# Altium footprint library AD_Lib.PcbLib: 508 footprints (part 13 of 32)
Each footprint in its own frame and in the unit in brackets; x right, y up, seen from the top. Pads: shape width x height; smd on the part's side, far side on the other; paste and mask are expansions set on the pad; w line width, h text height; cw(c..) or ccw(c..) is an arc to the next point about the centre after c.
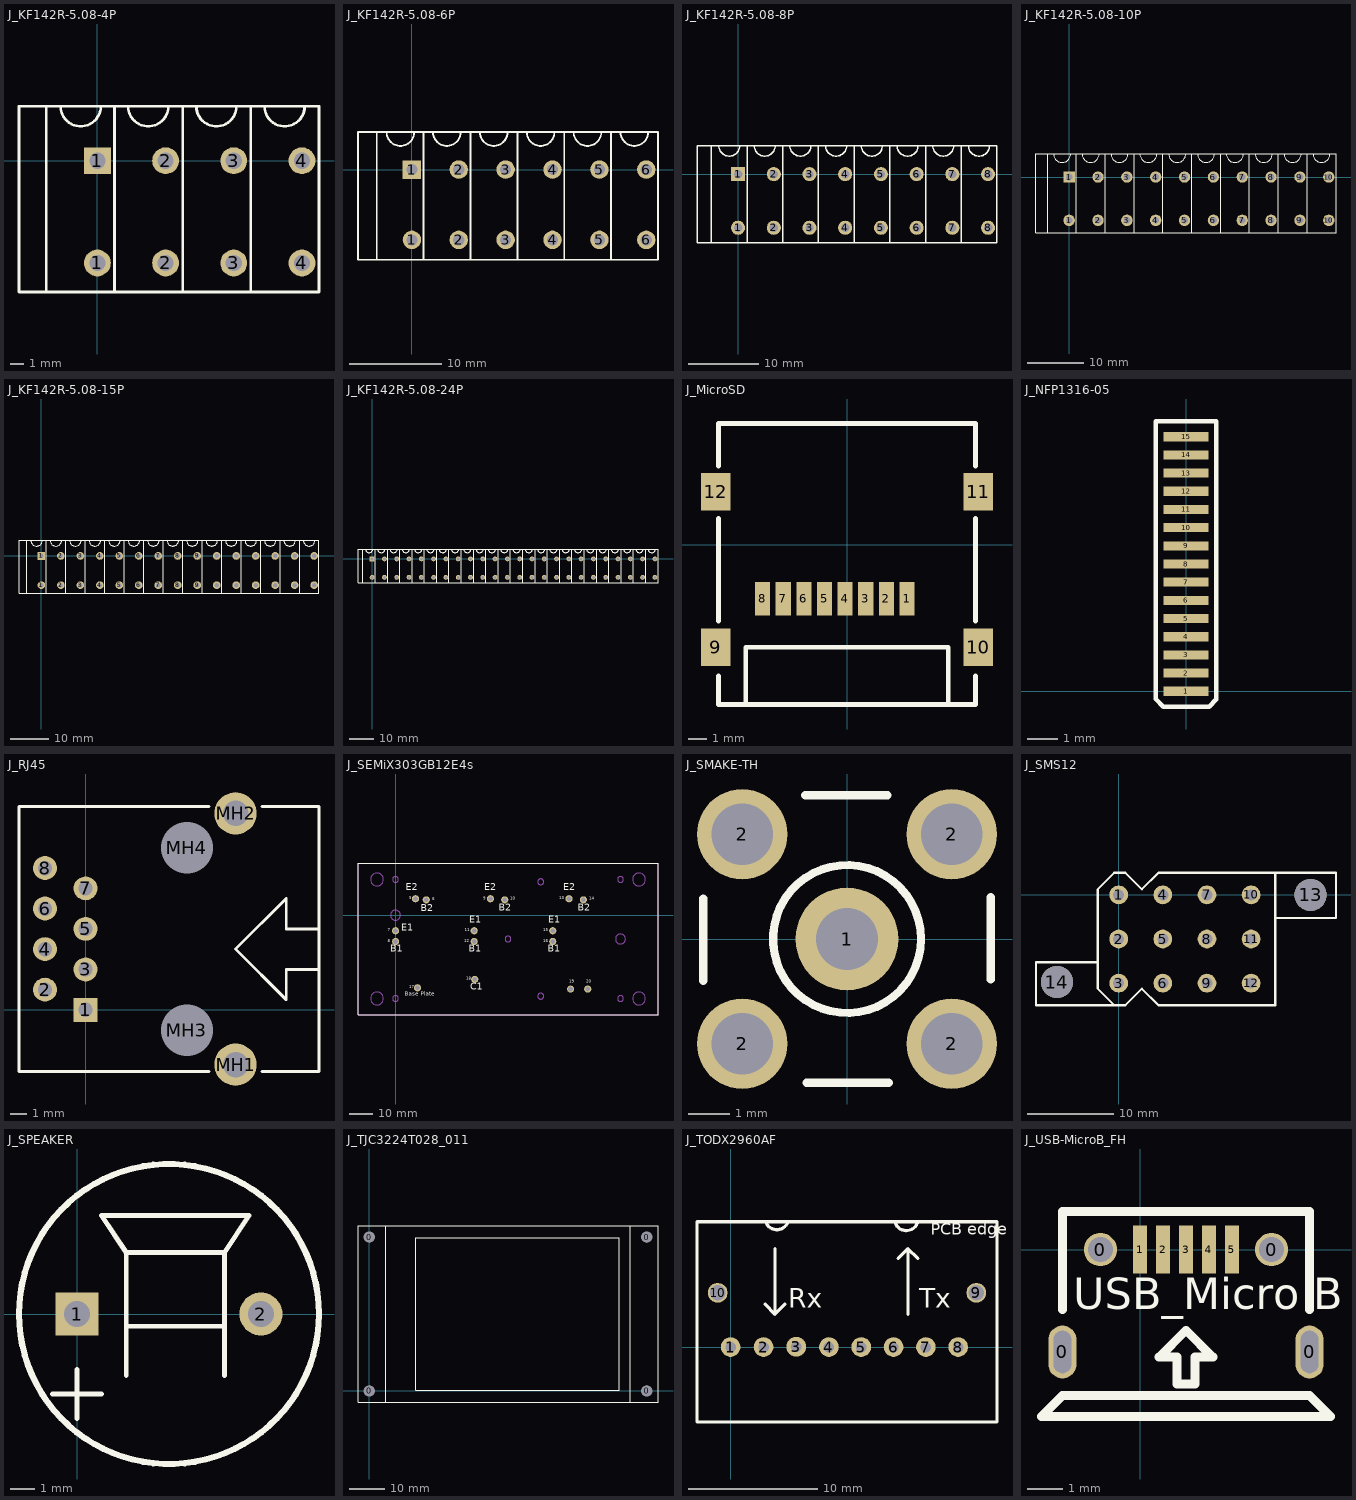
[diagram p12: the footprints below, top view; thin cyan lines are the x and y axes]

## J_KF142R-5.08-4P [mm] "弹簧式接线端子，可拼接；引脚间距5.08mm"
pads (8):
  round 2 hole 1.2: 1(0,-7.62) 2(5.08,-7.62) 2(5.08,0) 3(10.16,-7.62) 3(10.16,0) 4(15.24,-7.62) 4(15.24,0)
  rect 2x2 hole 1.2: 1(0,0)
Top Overlay:
  lines w0.2: -2.746,4.064 ccw(c-1.246,4.064) 0.254,4.064 ; 2.286,4.064 ccw(c3.786,4.064) 5.286,4.064 ; 7.366,4.064 ccw(c8.866,4.064) 10.366,4.064 ; 12.446,4.064 ccw(c13.946,4.064) 15.446,4.064 ; 6.35,-9.779 11.43,-9.779 ; 6.35,-9.779 6.35,4.064 ; 6.35,-9.779 -3.81,-9.779 -3.81,4.064 6.35,4.064 ; 6.35,4.064 11.43,4.064 ; 11.43,-9.779 16.51,-9.779 16.51,4.064 11.43,4.064 ; 11.43,-9.779 11.43,4.064
  lines w0.203: -3.81,-9.779 -5.842,-9.779 -5.842,4.064 -3.81,4.064 ; 1.27,-9.779 1.27,4.064

## J_KF142R-5.08-6P [mm] "弹簧式接线端子，可拼接；引脚间距5.08mm"
pads (12):
  round 2 hole 1.2: 1(0,-7.62) 2(5.08,-7.62) 2(5.08,0) 3(10.16,-7.62) 3(10.16,0) 4(15.24,-7.62) 4(15.24,0) 5(20.32,-7.62) 5(20.32,0) 6(25.4,-7.62) 6(25.4,0)
  rect 2x2 hole 1.2: 1(0,0)
Top Overlay:
  lines w0.2: -2.746,4.064 ccw(c-1.246,4.064) 0.254,4.064 ; 2.286,4.064 ccw(c3.786,4.064) 5.286,4.064 ; 7.366,4.064 ccw(c8.866,4.064) 10.366,4.064 ; 12.446,4.064 ccw(c13.946,4.064) 15.446,4.064 ; 17.526,4.064 ccw(c19.026,4.064) 20.526,4.064 ; 22.606,4.064 ccw(c24.106,4.064) 25.606,4.064 ; 6.35,-9.779 -3.81,-9.779 -3.81,4.064 6.35,4.064 ; 6.35,-9.779 6.35,4.064 ; 6.35,-9.779 11.43,-9.779 ; 6.35,4.064 11.43,4.064 ; 11.43,-9.779 11.43,4.064 ; 11.43,-9.779 16.51,-9.779 ; 11.43,4.064 16.51,4.064 ; 16.51,-9.779 16.51,4.064 ; 16.51,-9.779 21.59,-9.779 ; 16.51,4.064 21.59,4.064 ; 21.59,-9.779 21.59,4.064 ; 21.59,-9.779 26.67,-9.779 26.67,4.064 21.59,4.064
  lines w0.203: -3.81,-9.779 -5.842,-9.779 -5.842,4.064 -3.81,4.064 ; 1.27,-9.779 1.27,4.064

## J_KF142R-5.08-8P [mm] "弹簧式接线端子，可拼接；引脚间距5.08mm"
pads (16):
  round 2 hole 1.2: 1(0,-7.62) 2(5.08,-7.62) 2(5.08,0) 3(10.16,-7.62) 3(10.16,0) 4(15.24,-7.62) 4(15.24,0) 5(20.32,-7.62) 5(20.32,0) 6(25.4,-7.62) 6(25.4,0) 7(30.48,-7.62) 7(30.48,0) 8(35.56,-7.62) 8(35.56,0)
  rect 2x2 hole 1.2: 1(0,0)
Top Overlay:
  lines w0.2: -2.746,4.064 ccw(c-1.246,4.064) 0.254,4.064 ; 2.286,4.064 ccw(c3.786,4.064) 5.286,4.064 ; 7.366,4.064 ccw(c8.866,4.064) 10.366,4.064 ; 12.446,4.064 ccw(c13.946,4.064) 15.446,4.064 ; 17.526,4.064 ccw(c19.026,4.064) 20.526,4.064 ; 22.606,4.064 ccw(c24.106,4.064) 25.606,4.064 ; 27.686,4.064 ccw(c29.186,4.064) 30.686,4.064 ; 32.766,4.064 ccw(c34.266,4.064) 35.766,4.064 ; 6.35,-9.779 -3.81,-9.779 -3.81,4.064 6.35,4.064 ; 6.35,-9.779 6.35,4.064 ; 6.35,-9.779 11.43,-9.779 ; 6.35,4.064 11.43,4.064 ; 11.43,-9.779 11.43,4.064 ; 11.43,-9.779 16.51,-9.779 ; 11.43,4.064 16.51,4.064 ; 16.51,-9.779 16.51,4.064 ; 16.51,-9.779 21.59,-9.779 ; 16.51,4.064 21.59,4.064 ; 21.59,-9.779 21.59,4.064 ; 21.59,-9.779 26.67,-9.779 ; 21.59,4.064 26.67,4.064 ; 26.67,-9.779 26.67,4.064 ; 26.67,-9.779 31.75,-9.779 ; 26.67,4.064 31.75,4.064 ; 31.75,-9.779 31.75,4.064 ; 31.75,-9.779 36.83,-9.779 36.83,4.064 31.75,4.064
  lines w0.203: -3.81,-9.779 -5.842,-9.779 -5.842,4.064 -3.81,4.064 ; 1.27,-9.779 1.27,4.064

## J_KF142R-5.08-10P [mm] "弹簧式接线端子，可拼接；引脚间距5.08mm"
pads (20):
  round 2 hole 1.2: 1(0,-7.62) 2(5.08,-7.62) 2(5.08,0) 3(10.16,-7.62) 3(10.16,0) 4(15.24,-7.62) 4(15.24,0) 5(20.32,-7.62) 5(20.32,0) 6(25.4,-7.62) 6(25.4,0) 7(30.48,-7.62) 7(30.48,0) 8(35.56,-7.62) 8(35.56,0) 9(40.64,-7.62) 9(40.64,0) 10(45.72,-7.62) 10(45.72,0)
  rect 2x2 hole 1.2: 1(0,0)
Top Overlay:
  lines w0.2: -2.746,4.064 ccw(c-1.246,4.064) 0.254,4.064 ; 2.286,4.064 ccw(c3.786,4.064) 5.286,4.064 ; 7.366,4.064 ccw(c8.866,4.064) 10.366,4.064 ; 12.446,4.064 ccw(c13.946,4.064) 15.446,4.064 ; 17.526,4.064 ccw(c19.026,4.064) 20.526,4.064 ; 22.606,4.064 ccw(c24.106,4.064) 25.606,4.064 ; 27.686,4.064 ccw(c29.186,4.064) 30.686,4.064 ; 32.766,4.064 ccw(c34.266,4.064) 35.766,4.064 ; 37.846,4.064 ccw(c39.346,4.064) 40.846,4.064 ; 42.926,4.064 ccw(c44.426,4.064) 45.926,4.064 ; 6.35,-9.779 -3.81,-9.779 -3.81,4.064 6.35,4.064 ; 6.35,-9.779 6.35,4.064 ; 6.35,-9.779 11.43,-9.779 ; 6.35,4.064 11.43,4.064 ; 11.43,-9.779 11.43,4.064 ; 11.43,-9.779 16.51,-9.779 ; 11.43,4.064 16.51,4.064 ; 16.51,-9.779 16.51,4.064 ; 16.51,-9.779 21.59,-9.779 ; 16.51,4.064 21.59,4.064 ; 21.59,-9.779 21.59,4.064 ; 21.59,-9.779 26.67,-9.779 ; 21.59,4.064 26.67,4.064 ; 26.67,-9.779 26.67,4.064 ; 26.67,-9.779 31.75,-9.779 ; 26.67,4.064 31.75,4.064 ; 31.75,-9.779 31.75,4.064 ; 31.75,-9.779 36.83,-9.779 ; 31.75,4.064 36.83,4.064 ; 36.83,-9.779 36.83,4.064 ; 36.83,-9.779 41.91,-9.779 ; 36.83,4.064 41.91,4.064 ; 41.91,-9.779 41.91,4.064 ; 41.91,-9.779 46.99,-9.779 46.99,4.064 41.91,4.064
  lines w0.203: -3.81,-9.779 -5.842,-9.779 -5.842,4.064 -3.81,4.064 ; 1.27,-9.779 1.27,4.064

## J_KF142R-5.08-15P [mm] "弹簧式接线端子，可拼接；引脚间距5.08mm"
pads (30):
  round 2 hole 1.2: 1(0,-7.62) 2(5.08,-7.62) 2(5.08,0) 3(10.16,-7.62) 3(10.16,0) 4(15.24,-7.62) 4(15.24,0) 5(20.32,-7.62) 5(20.32,0) 6(25.4,-7.62) 6(25.4,0) 7(30.48,-7.62) 7(30.48,0) 8(35.56,-7.62) 8(35.56,0) 9(40.64,-7.62) 9(40.64,0) 10(45.72,-7.62) 10(45.72,0) 11(50.8,-7.62) 11(50.8,0) 12(55.88,-7.62) 12(55.88,0) 13(60.96,-7.62) 13(60.96,0) 14(66.04,-7.62) 14(66.04,0) 15(71.12,-7.62) 15(71.12,0)
  rect 2x2 hole 1.2: 1(0,0)
Top Overlay:
  lines w0.2: -2.746,4.064 ccw(c-1.246,4.064) 0.254,4.064 ; 2.286,4.064 ccw(c3.786,4.064) 5.286,4.064 ; 7.366,4.064 ccw(c8.866,4.064) 10.366,4.064 ; 12.446,4.064 ccw(c13.946,4.064) 15.446,4.064 ; 17.526,4.064 ccw(c19.026,4.064) 20.526,4.064 ; 22.606,4.064 ccw(c24.106,4.064) 25.606,4.064 ; 27.686,4.064 ccw(c29.186,4.064) 30.686,4.064 ; 32.766,4.064 ccw(c34.266,4.064) 35.766,4.064 ; 37.846,4.064 ccw(c39.346,4.064) 40.846,4.064 ; 42.926,4.064 ccw(c44.426,4.064) 45.926,4.064 ; 48.006,4.064 ccw(c49.506,4.064) 51.006,4.064 ; 53.086,4.064 ccw(c54.586,4.064) 56.086,4.064 ; 58.166,4.064 ccw(c59.666,4.064) 61.166,4.064 ; 63.246,4.064 ccw(c64.746,4.064) 66.246,4.064 ; 68.326,4.064 ccw(c69.826,4.064) 71.326,4.064 ; 6.35,-9.779 -3.81,-9.779 -3.81,4.064 6.35,4.064 ; 6.35,-9.779 6.35,4.064 ; 6.35,-9.779 11.43,-9.779 ; 6.35,4.064 11.43,4.064 ; 11.43,-9.779 11.43,4.064 ; 11.43,-9.779 16.51,-9.779 ; 11.43,4.064 16.51,4.064 ; 16.51,-9.779 16.51,4.064 ; 16.51,-9.779 21.59,-9.779 ; 16.51,4.064 21.59,4.064 ; 21.59,-9.779 21.59,4.064 ; 21.59,-9.779 26.67,-9.779 ; 21.59,4.064 26.67,4.064 ; 26.67,-9.779 26.67,4.064 ; 26.67,-9.779 31.75,-9.779 ; 26.67,4.064 31.75,4.064 ; 31.75,-9.779 31.75,4.064 ; 31.75,-9.779 36.83,-9.779 ; 31.75,4.064 36.83,4.064 ; 36.83,-9.779 36.83,4.064 ; 36.83,-9.779 41.91,-9.779 ; 36.83,4.064 41.91,4.064 ; 41.91,-9.779 41.91,4.064 ; 41.91,-9.779 46.99,-9.779 ; 41.91,4.064 46.99,4.064 ; 46.99,-9.779 52.07,-9.779 ; 46.99,-9.779 46.99,4.064 ; 46.99,4.064 52.07,4.064 ; 52.07,-9.779 57.15,-9.779 ; 52.07,-9.779 52.07,4.064 ; 52.07,4.064 57.15,4.064 ; 57.15,-9.779 62.23,-9.779 ; 57.15,-9.779 57.15,4.064 ; 57.15,4.064 62.23,4.064 ; 62.23,-9.779 67.31,-9.779 ; 62.23,-9.779 62.23,4.064 ; 62.23,4.064 67.31,4.064 ; 67.31,-9.779 67.31,4.064 ; 67.31,-9.779 72.39,-9.779 72.39,4.064 67.31,4.064
  lines w0.203: -3.81,-9.779 -5.842,-9.779 -5.842,4.064 -3.81,4.064 ; 1.27,-9.779 1.27,4.064

## J_KF142R-5.08-24P [mm] "弹簧式接线端子，可拼接；引脚间距5.08mm"
pads (48):
  round 2 hole 1.2: 1(0,-7.62) 2(5.08,-7.62) 2(5.08,0) 3(10.16,-7.62) 3(10.16,0) 4(15.24,-7.62) 4(15.24,0) 5(20.32,-7.62) 5(20.32,0) 6(25.4,-7.62) 6(25.4,0) 7(30.48,-7.62) 7(30.48,0) 8(35.56,-7.62) 8(35.56,0) 9(40.64,-7.62) 9(40.64,0) 10(45.72,-7.62) 10(45.72,0) 11(50.8,-7.62) 11(50.8,0) 12(55.88,-7.62) 12(55.88,0) 13(60.96,-7.62) 13(60.96,0) 14(66.04,-7.62) 14(66.04,0) 15(71.12,-7.62) 15(71.12,0) 16(76.2,-7.62) 16(76.2,0) 17(81.28,-7.62) 17(81.28,0) 18(86.36,-7.62) 18(86.36,0) 19(91.44,-7.62) 19(91.44,0) 20(96.52,-7.62) 20(96.52,0) 21(101.6,-7.62) 21(101.6,0) 22(106.68,-7.62) 22(106.68,0) 23(111.76,-7.62) 23(111.76,0) 24(116.84,-7.62) 24(116.84,0)
  rect 2x2 hole 1.2: 1(0,0)
Top Overlay:
  lines w0.2: -2.746,4.064 ccw(c-1.246,4.064) 0.254,4.064 ; 2.286,4.064 ccw(c3.786,4.064) 5.286,4.064 ; 7.366,4.064 ccw(c8.866,4.064) 10.366,4.064 ; 12.446,4.064 ccw(c13.946,4.064) 15.446,4.064 ; 17.526,4.064 ccw(c19.026,4.064) 20.526,4.064 ; 22.606,4.064 ccw(c24.106,4.064) 25.606,4.064 ; 27.686,4.064 ccw(c29.186,4.064) 30.686,4.064 ; 32.766,4.064 ccw(c34.266,4.064) 35.766,4.064 ; 37.846,4.064 ccw(c39.346,4.064) 40.846,4.064 ; 42.926,4.064 ccw(c44.426,4.064) 45.926,4.064 ; 48.006,4.064 ccw(c49.506,4.064) 51.006,4.064 ; 53.086,4.064 ccw(c54.586,4.064) 56.086,4.064 ; 58.166,4.064 ccw(c59.666,4.064) 61.166,4.064 ; 63.246,4.064 ccw(c64.746,4.064) 66.246,4.064 ; 68.326,4.064 ccw(c69.826,4.064) 71.326,4.064 ; 73.406,4.064 ccw(c74.906,4.064) 76.406,4.064 ; 78.486,4.064 ccw(c79.986,4.064) 81.486,4.064 ; 83.566,4.064 ccw(c85.066,4.064) 86.566,4.064 ; 88.646,4.064 ccw(c90.146,4.064) 91.646,4.064 ; 93.726,4.064 ccw(c95.226,4.064) 96.726,4.064 ; 98.806,4.064 ccw(c100.306,4.064) 101.806,4.064 ; 103.886,4.064 ccw(c105.386,4.064) 106.886,4.064 ; 108.966,4.064 ccw(c110.466,4.064) 111.966,4.064 ; 114.046,4.064 ccw(c115.546,4.064) 117.046,4.064 ; 6.35,-9.779 -3.81,-9.779 -3.81,4.064 6.35,4.064 ; 6.35,-9.779 6.35,4.064 ; 6.35,-9.779 11.43,-9.779 ; 6.35,4.064 11.43,4.064 ; 11.43,-9.779 11.43,4.064 ; 11.43,-9.779 16.51,-9.779 ; 11.43,4.064 16.51,4.064 ; 16.51,-9.779 16.51,4.064 ; 16.51,-9.779 21.59,-9.779 ; 16.51,4.064 21.59,4.064 ; 21.59,-9.779 21.59,4.064 ; 21.59,-9.779 26.67,-9.779 ; 21.59,4.064 26.67,4.064 ; 26.67,-9.779 26.67,4.064 ; 26.67,-9.779 31.75,-9.779 ; 26.67,4.064 31.75,4.064 ; 31.75,-9.779 31.75,4.064 ; 31.75,-9.779 36.83,-9.779 ; 31.75,4.064 36.83,4.064 ; 36.83,-9.779 36.83,4.064 ; 36.83,-9.779 41.91,-9.779 ; 36.83,4.064 41.91,4.064 ; 41.91,-9.779 41.91,4.064 ; 41.91,-9.779 46.99,-9.779 ; 41.91,4.064 46.99,4.064 ; 46.99,-9.779 52.07,-9.779 ; 46.99,-9.779 46.99,4.064 ; 46.99,4.064 52.07,4.064 ; 52.07,-9.779 57.15,-9.779 ; 52.07,-9.779 52.07,4.064 ; 52.07,4.064 57.15,4.064 ; 57.15,-9.779 62.23,-9.779 ; 57.15,-9.779 57.15,4.064 ; 57.15,4.064 62.23,4.064 ; 62.23,-9.779 67.31,-9.779 ; 62.23,-9.779 62.23,4.064 ; 62.23,4.064 67.31,4.064 ; 67.31,-9.779 67.31,4.064 ; 67.31,-9.779 72.39,-9.779 ; 67.31,4.064 72.39,4.064 ; 72.39,-9.779 72.39,4.064 ; 72.39,-9.779 77.47,-9.779 ; 72.39,4.064 77.47,4.064 ; 77.47,-9.779 77.47,4.064 ; 77.47,-9.779 82.55,-9.779 ; 77.47,4.064 82.55,4.064 ; 82.55,-9.779 82.55,4.064 ; 82.55,-9.779 87.63,-9.779 ; 82.55,4.064 87.63,4.064 ; 87.63,-9.779 87.63,4.064 ; 87.63,-9.779 92.71,-9.779 ; 87.63,4.064 92.71,4.064 ; 92.71,-9.779 92.71,4.064 ; 92.71,-9.779 97.79,-9.779 ; 92.71,4.064 97.79,4.064 ; 97.79,-9.779 97.79,4.064 ; 97.79,-9.779 102.87,-9.779 ; 97.79,4.064 102.87,4.064 ; 102.87,-9.779 102.87,4.064 ; 102.87,-9.779 107.95,-9.779 ; 102.87,4.064 107.95,4.064 ; 107.95,-9.779 107.95,4.064 ; 107.95,-9.779 113.03,-9.779 ; 107.95,4.064 113.03,4.064 ; 113.03,-9.779 113.03,4.064 ; 113.03,-9.779 118.11,-9.779 118.11,4.064 113.03,4.064
  lines w0.203: -3.81,-9.779 -5.842,-9.779 -5.842,4.064 -3.81,4.064 ; 1.27,-9.779 1.27,4.064

## J_MicroSD [mm]
pads (12):
  rect 0.8x1.8 smd: 1(3.2,-2.875) 2(2.1,-2.875) 3(1,-2.875) 4(-0.1,-2.875) 5(-1.2,-2.875) 6(-2.3,-2.875) 7(-3.4,-2.875) 8(-4.5,-2.875)
  rect 1.6x2 smd paste-0.2: 9(-7,-5.475)
  rect 1.6x2 smd paste-0.15: 10(7,-5.475) 11(7,2.825) 12(-7,2.825)
Top Overlay:
  lines w0.254: -6.85,-6.985 -6.85,-8.525 6.85,-8.525 6.85,-6.985 ; -6.85,-4.064 -6.85,1.397 ; -6.85,4.191 -6.85,6.475 6.85,6.475 6.85,4.191 ; -5.4,-8.525 -5.4,-5.465 5.4,-5.465 5.4,-8.525 ; 6.85,-4.064 6.85,1.397

## J_NFP1316-05 [mm] "FFC/FPC扁平电缆插座，15Pin，间距0.6mm"
height 5
pads (15):
  rect 1.5x0.3 smd: 1(0,0) 2(0,0.6) 3(0,1.2) 4(0,1.8) 5(0,2.4) 6(0,3) 7(0,3.6) 8(0,4.2) 9(0,4.8) 10(0,5.4) 11(0,6) 12(0,6.6) 13(0,7.2) 14(0,7.8) 15(0,8.4)
Top Overlay:
  lines w0.152: -1,-0.254 -1,8.908 1,8.908 1,-0.27 0.762,-0.508 -0.746,-0.508 -1,-0.254

## J_RJ45 [mm] "以太网连接器"
height 9.65
pads (12):
  rect 1.5x1.5 hole 0.9: 1(0,0)
  round 1.5 hole 0.9: 2(-2.54,1.27) 3(0,2.54) 4(-2.54,3.81) 5(0,5.08) 6(-2.54,6.35) 7(0,7.62) 8(-2.54,8.89)
  round 2.65 hole 1.6: MH1(9.4,-3.43) MH2(9.4,12.32)
  round 2.95 hole 3.25 unplated: MH3(6.35,-1.27) MH4(6.35,10.16)
Top Overlay:
  lines w0.178: 14.558,2.54 12.573,2.54 12.573,0.635 9.398,3.81 12.573,6.985 12.573,5.08 14.558,5.08
  lines w0.2: 7.728,-3.855 -4.17,-3.855 -4.17,12.745 7.728,12.745 ; 11.072,-3.855 14.63,-3.855 14.63,12.745 11.072,12.745

## J_SEMiX303GB12E4s [mm] "Semikron半桥模块"
height 23
pads (16):
  round 3 hole 2: 5(8.4,6.9) 6(12.9,6.45) 7(0.05,-6.55) 8(0.05,-11.05) 9(39.85,6.9) 10(45.9,6.45) 11(33.05,-6.55) 12(33.05,-11.05) 13(72.85,6.9) 14(78.9,6.45) 15(66.05,-6.55) 16(66.05,-11.05) 17(9.25,-30.5) 18(33.3,-26.95) 19(73.55,-31.05) 20(80.75,-31.05)
Top Overlay:
  lines w0.3: -15.75,-41.75 110.25,-41.75 110.25,21.75 -15.75,21.75 -15.75,-41.75
  text "B1" at 63.881,-16.383 h5
  text "E1" at 64.135,-4.191 h5
  text "16" at 62.103,-11.684 h2
  text "15" at 62.103,-7.239 h2
  text "19" at 72.898,-28.829 h2
  text "20" at 80.137,-28.829 h2
  text "17" at 5.715,-31.115 h2
  text "18" at 29.718,-27.559 h2
  text "Base Plate" at 3.81,-34.544 h3
  text "6" at 15.367,5.842 h2
  text "5" at 5.715,6.223 h2
  text "10" at 48.133,5.969 h2
  text "9" at 36.83,6.096 h2
  text "13" at 68.834,6.223 h2
  text "14" at 81.407,5.969 h2
  text "8" at -3.175,-11.684 h2
  text "7" at -3.175,-7.239 h2
  text "12" at 28.956,-11.684 h2
  text "11" at 29.083,-7.239 h2
  text "B2" at 10.541,0.635 h5
  text "E2" at 4.318,9.398 h5
  text "B2" at 43.434,0.762 h5
  text "E2" at 37.338,9.398 h5
  text "E2" at 70.358,9.398 h5
  text "B2" at 76.454,0.762 h5
  text "E1" at 2.413,-7.62 h5
  text "E1" at 30.988,-4.191 h5
  text "B1" at -2.159,-16.383 h5
  text "B1" at 30.734,-16.383 h5
  text "C1" at 31.496,-32.385 h5
Bottom Overlay:
  text "B1" at 67.31,-16.383 h5
  text "E1" at 67.564,-4.191 h5
  text "16" at 63.5,-11.684 h2
  text "15" at 63.5,-7.184 h2
  text "19" at 74.295,-28.829 h2
  text "20" at 81.534,-28.829 h2
  text "17" at 6.985,-31.115 h2
  text "18" at 31.115,-27.559 h2
  text "Base Plate" at 13.97,-34.544 h3
  text "6" at 16.002,5.842 h2
  text "5" at 6.35,6.223 h2
  text "10" at 49.53,5.969 h2
  text "9" at 37.465,6.096 h2
  text "13" at 70.27,6.266 h2
  text "14" at 82.931,5.969 h2
  text "8" at -2.53,-11.684 h2
  text "7" at -2.53,-7.184 h2
  text "12" at 30.47,-11.684 h2
  text "11" at 30.47,-7.184 h2
  text "B2" at 14.438,0.709 h5
  text "E2" at 8.295,9.398 h5
  text "B2" at 47.438,0.709 h5
  text "E2" at 41.295,9.398 h5
  text "E2" at 74.295,9.398 h5
  text "B2" at 80.438,0.709 h5
  text "E1" at 5.842,-7.62 h5
  text "E1" at 34.417,-4.191 h5
  text "B1" at 1.27,-16.383 h5
  text "B1" at 34.29,-16.383 h5
  text "C1" at 35.433,-32.385 h5
  text "guide pin" at 4.191,3.937 h3
  text "(15.75, 41.75)" at -3.81,-40.64 h2.54
Mechanical 1:
  circle w0.254: c94.5,-10 r2.1
  circle w0.254: c0,0 r2.1
  circle w0.254: c47.25,-10 r1.25
  circle w0.254: c61,-34 r1.25
  circle w0.254: c61,14 r1.25
  circle w0.254: c102.244,15.014 r2.7
  circle w0.254: c102.244,-34.986 r2.7
  circle w0.254: c-7.756,-34.986 r2.7
  circle w0.254: c-7.753,15 r2.7
  circle w0.254: c94.5,15 r1.25
  circle w0.254: c94.5,-35 r1.25
  circle w0.254: c0,-35 r1.25
  circle w0.254: c0,15 r1.25
  lines w0.3: -15.75,-41.75 110.25,-41.75 110.25,21.75 -15.75,21.75 -15.75,-41.75

## J_SMAKE-TH [mm] "SMAKE正脚，立式"
height 13.5
pads (5):
  round 2.5 hole 1.5: 1(0,0)
  round 2.2 hole 1.5: 2(-2.55,-2.55) 2(-2.55,2.55) 2(2.55,-2.55) 2(2.55,2.55)
Top Overlay:
  circle w0.2: c0,0 r1.8
  lines w0.2: -3.5,-1.016 -3.5,0.984 ; -1.016,3.5 0.984,3.5 ; -0.984,-3.5 1.016,-3.5 ; 3.5,-0.984 3.5,1.016

## J_SMS12 [mil] "板载连接器，3*4"
height 803.15
pads (14):
  round 85 hole 50: 1(0,0) 2(0,-200) 3(0,-400) 4(200,0) 5(200,-200) 6(200,-400) 7(400,0) 8(400,-200) 9(400,-400) 10(600,0) 11(600,-200) 12(600,-400)
  round 145.67 hole 145.67: 13(870,0) 14(-280,-395)
Top Overlay:
  lines w10: -95,-305 -375,-305 -375,-500 -20,-500 ; 710,-105 985,-105 985,100 710,100 ; -20,-500 -95,-425 -95,25 -20,100 30,100 105,25 180,100 710,100 ; -20,-500 30,-500 105,-425 180,-500 710,-500 710,100

## J_SPEAKER [mil] "扬声器，12*9.5"
height 43.31
pads (2):
  rect 70x70 hole 42: 1(0,0)
  round 70 hole 42: 2(299.21,0)
Top Overlay:
  circle w10: c149.61,0 r244.09
  lines w8: -40,-130 -20,-130 20,-130 40,-130 ; 0,-170 0,-110 0,-90 ; 80,-100 80,-20 ; 240,-100 240,-20 ; 80,-20 80,100 ; 80,-20 240,-20 ; 80,100 40,160 60,160 280,160 240,100 ; 80,100 240,100 ; 240,-20 240,100

## J_TJC3224T028_011 [mm] "TJC 2.8寸触摸屏"
height 12
pads (4):
  round 3 hole 3.2: 0(0,0) 0(0,43.6) 0(78.6,0) 0(78.6,43.6)
Top Overlay:
  lines w0.2: 4.7,-3.2 4.7,46.8 ; 73.9,-3.2 73.9,46.8 ; -3.2,-3.2 81.8,-3.2 81.8,46.8 -3.2,46.8 -3.2,-3.2 ; 13.2,0.2 70.8,0.2 70.8,43.4 13.2,43.4 13.2,0.2
Bottom Overlay:
  lines w0.2: 0,0 0,43.6 78.6,43.6 78.6,0 0,0

## J_TODX2960AF [mm] "Toshiba之JIS F07型光纤接口"
height 8.25
pads (10):
  round 1.524 hole 0.8: 1(0,0) 2(2.55,0) 3(5.075,0.025) 4(7.6,0) 5(10.1,0) 6(12.6,0) 7(15.1,0) 8(17.6,0)
  round 1.524 hole 1.2: 9(19,4.2) 10(-1,4.2)
Top Overlay:
  lines w0.254: 2.667,3.302 3.429,2.54 ; 2.712,9.685 ccw(c3.576,9.999) 4.445,9.7 ; 3.429,7.62 3.429,2.54 ; 4.191,3.302 3.429,2.54 ; 12.723,9.612 ccw(c13.587,9.926) 14.478,9.7 ; 12.954,6.858 13.716,7.62 ; 13.716,2.54 13.716,7.62 ; 14.478,6.858 13.716,7.62 ; -2.6,-5.8 20.6,-5.8 20.6,9.7 -2.6,9.7 -2.6,-5.8
  text "Tx" at 14.605,2.54 h2.54
  text "Rx" at 4.445,2.54 h2.54
  text "PCB edge" at 15.494,8.382 h1.52

## J_USB-MicroB_FH [mm] "USB connector; Micro-B Receptacle; SMT"
height 2.35
pads (9):
  oval 0.8x1.5 hole 0.5 slot 1.2 at 90 deg: 0(-2.2,-2.9) 0(4.8,-2.9)
  round 0.94 hole 0.7: 0(-1.125,0) 0(3.725,0)
  rect 0.4x1.35 smd: 1(0,0) 2(0.65,0) 3(1.3,0) 4(1.95,0) 5(2.6,0)
Top Overlay:
  lines w0.254: -2.2,-1.7 -2.2,1.084 4.8,1.084 4.8,-1.7 ; -2.8,-4.735 5.4,-4.735 4.8,-4.135 -2.2,-4.135 -2.8,-4.735 ; 0.538,-3.048 1.3,-2.286 2.062,-3.048 1.554,-3.048 1.554,-3.81 1.046,-3.81 1.046,-3.048 0.538,-3.048
  text "USB_Micro B" at -1.9,-1.983 h1.52